# Altium footprint library cat.PcbLib: 78 footprints (part 2 of 5)
Each footprint in its own frame and in the unit in brackets; x right, y up, seen from the top. Pads: shape width x height; smd on the part's side, far side on the other; paste and mask are expansions set on the pad; w line width, h text height; cw(c..) or ccw(c..) is an arc to the next point about the centre after c.
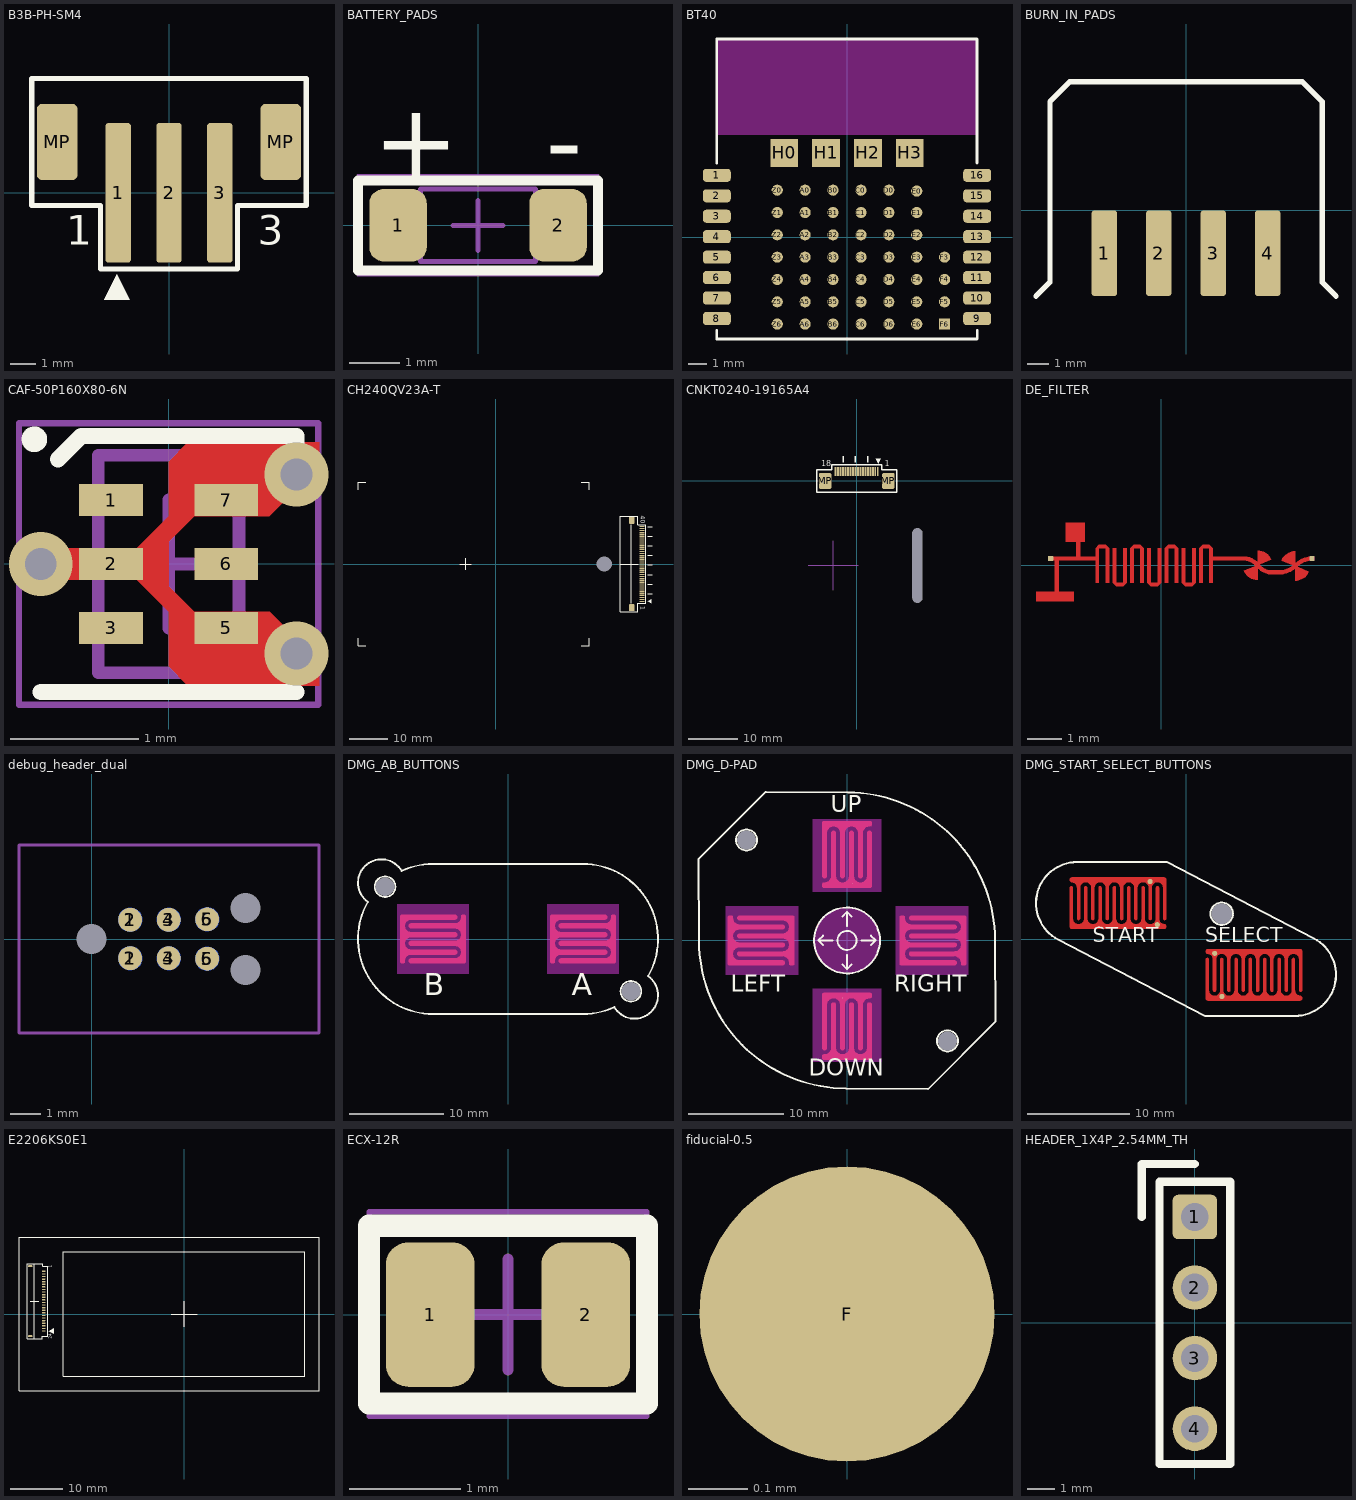
[diagram p1: the footprints below, top view; thin cyan lines are the x and y axes]

## B3B-PH-SM4 [mm]
pads (5):
  rrect25% 1x5.5 smd: 1(-2,0) 2(0,0) 3(2,0)
  rrect25% 1.6x3 smd: MP(-4.4,2) MP(4.4,2)
Top Overlay:
  region: -2.05,-3.2 -2.55,-4.2 -1.55,-4.2
  lines w0.2: -5.4,-0.5 -5.4,4.5 5.4,4.5 5.4,-0.5 2.7,-0.5 2.7,-3 -2.7,-3 -2.7,-0.5 -5.4,-0.5
  text "1" at -4.036,-2.442 h2
  text "3" at 3.481,-2.431 h2
3D body "B3B-PH-SM4-TB.STEP": height 6.6, standoff 0, extent -4.975,-2.5 4.975,4.5

## BATTERY_PADS [mm]
height 0.95
pads (2):
  rrect50% 1.15x1.45 smd: 1(-1.6,0) 2(1.6,0)
Top Overlay:
  lines w0.2: -2.4,-0.9 -2.4,0.9 2.4,0.9 2.4,-0.9 -2.4,-0.9
  text "+" at -2.1,0.95 h1.5
  text "-" at 2.1,0.95 h1.5
Mechanical 13:
  lines w0.1: -1.15,-0.725 -1.15,0.725 1.15,0.725 1.15,-0.725 -1.15,-0.725
Mechanical 15:
  lines w0.05: -2.4,-1 -2.4,1 2.4,1 2.4,-1 -2.4,-1
  lines w0.1: -0.5,0 0.5,0 ; 0,-0.5 0,0.5

## BT40 [mm] "BLE Module"
pads (66):
  rrect50% 1.5x0.7 smd: 1(-7,3.332) 2(-7,2.232) 3(-7,1.132) 4(-7,0.032) 5(-7,-1.068) 6(-7,-2.168) 7(-7,-3.268) 8(-7,-4.368) 9(7,-4.368) 10(7,-3.268) 11(7,-2.168) 12(7,-1.068) 13(7,0.032) 14(7,1.132) 15(7,2.232) 16(7,3.332)
  round 0.6 smd: A0(-2.25,2.533) A1(-2.25,1.333) A2(-2.25,0.133) A3(-2.25,-1.067) A4(-2.25,-2.267) A5(-2.25,-3.467) A6(-2.25,-4.667) B0(-0.75,2.533) B1(-0.75,1.333) B2(-0.75,0.133) B3(-0.75,-1.067) B4(-0.75,-2.267) B5(-0.75,-3.467) B6(-0.75,-4.667) C0(0.75,2.533) C1(0.75,1.333) C2(0.75,0.133) C3(0.75,-1.067) C4(0.75,-2.267) C5(0.75,-3.467) C6(0.75,-4.667) D0(2.25,2.533) D1(2.25,1.333) D2(2.25,0.133) D3(2.25,-1.067) D4(2.25,-2.267) D5(2.25,-3.467) D6(2.25,-4.667) E0(3.75,2.485) E1(3.75,1.333) E2(3.75,0.133) E3(3.75,-1.067) E4(3.75,-2.267) E5(3.75,-3.467) E6(3.75,-4.667) F3(5.25,-1.067) F4(5.25,-2.267) F5(5.25,-3.467) Z0(-3.75,2.533) Z1(-3.75,1.333) Z2(-3.75,0.133) Z3(-3.75,-1.067) Z4(-3.75,-2.267) Z5(-3.75,-3.467) Z6(-3.75,-4.667)
  rect 0.6x0.6 smd: F6(5.25,-4.667)
  rect 1.5x1.5 smd: H0(-3.375,4.533) H1(-1.125,4.533) H2(1.125,4.533) H3(3.375,4.533)
Top Layer keep-out:
  rectangle: -7,5.5 6.997,10.662
Top Overlay:
  lines w0.152: -7.005,-5.464 -7.005,-5 ; -7.003,-5.468 6.997,-5.468 ; -7,4 -7,10.654 -6.992,10.662 6.997,10.662 6.997,4 ; 7,-5.457 7,-5
3D body "bt40_ble_module.step": height 2.01, standoff 0.01, extent -6.997,-5.378 7.003,10.662

## BURN_IN_PADS [mm]
pads (4):
  rrect25% 1.2x4 smd paste-2539.97 mask+0: 1(-3.81,-2) 2(-1.27,-2) 3(1.27,-2) 4(3.81,-2)
Top Overlay:
  lines w0.25: -7,-4 -6.35,-3.35 -6.35,3.81 -6.35,5.08 -5.43,6 5.43,6 6.35,5.08 6.35,-3.107 6.35,-3.35 7,-4

## CAF-50P160X80-6N [mm] "Chip Array, Flat, 6-Leads, Pitch 0,50mm,  Body 1,60x0,80mm,  IPC Medium Density"
height 0.7
pads (6):
  rect 0.5x0.25 smd mask+0.08: 1(-0.45,0.5) 2(-0.45,0) 3(-0.45,-0.5) 5(0.45,-0.5) 6(0.45,0) 7(0.45,0.5)
via -1,0 diameter 0.5 hole 0.25
via 1,0.7 diameter 0.5 hole 0.25
via 1,-0.7 diameter 0.5 hole 0.25
Top Layer:
  region: 0.786,0.375 0.2,0.375 0,0.175 0,-0.175 0.2,-0.375 0.789,-0.375 1.175,-0.761 1.175,-0.95 0.15,-0.95 0,-0.8 0,-0.375 -0.25,-0.125 -0.8,-0.125 -0.9,-0.225 -1,-0.225 -1,0.225 -0.9,0.225 -0.8,0.125 -0.25,0.125 0,0.375 0,0.8 0.15,0.95 1.175,0.95 1.175,0.764
Top Overlay:
  circle w0.1: c-1.05,0.975 r0.05
  lines w0.127: -1,-1 1,-1 ; -0.865,0.819 -0.858,0.826 ; 1,0.683 1,1 -0.683,1 -0.857,0.826 ; -0.858,0.826 -0.857,0.826
Mechanical 13:
  lines w0.1: -0.55,-0.85 -0.55,0.85 0.55,0.85 0.55,-0.85 -0.55,-0.85
Mechanical 15:
  lines w0.05: -1.17,-1.1 -1.17,1.1 1.17,1.1 1.17,-1.1 -1.17,-1.1
  lines w0.1: -0.5,0 0.5,0 ; 0,-0.5 0,0.5
3D body: height 0.7, standoff 0, extent -0.525,-0.85 0.475,0.85
3D body: height 0.7, standoff 0, extent -0.087,0.725 0.088,0.875
3D body: height 0.7, standoff 0, extent -0.087,-0.875 0.088,-0.725
3D body: height 0.7, standoff 0.5, extent -0.087,0.15 0.088,0.45

## CH240QV23A-T [mm]
pads (43):
  rrect25% 1.3x0.3 smd: 1(38.2,-9.75) 2(38.2,-9.25) 3(38.2,-8.75) 4(38.2,-8.25) 5(38.2,-7.75) 6(38.2,-7.25) 7(38.2,-6.75) 8(38.2,-6.25) 9(38.2,-5.75) 10(38.2,-5.25) 11(38.2,-4.75) 12(38.2,-4.25) 13(38.2,-3.75) 14(38.2,-3.25) 15(38.2,-2.75) 16(38.2,-2.25) 17(38.2,-1.75) 18(38.2,-1.25) 19(38.2,-0.75) 20(38.2,-0.25) 21(38.2,0.25) 22(38.2,0.75) 23(38.2,1.25) 24(38.2,1.75) 25(38.2,2.25) 26(38.2,2.75) 27(38.2,3.25) 28(38.2,3.75) 29(38.2,4.25) 30(38.2,4.75) 31(38.2,5.25) 32(38.2,5.75) 33(38.2,6.25) 34(38.2,6.75) 35(38.2,7.25) 36(38.2,7.75) 37(38.2,8.25) 38(38.2,8.75) 39(38.2,9.25) 40(38.2,9.75)
  rrect25% 1.4x1.8 smd: MP(35.55,-11.4) MP(35.55,11.4)
  round 0 hole 4 square unplated: ""(28.4,0)
Top Overlay:
  region: 39.7,-9.75 40.7,-10.25 40.7,-9.25
  lines w0.2: -35.91,-19.4 -35.91,-21.4 -33.9,-21.4 ; -35.91,19.4 -35.91,21.4 -33.9,21.4 ; -9.35,0 -6.35,0 ; -7.81,-1.5 -7.81,1.5 ; 22.4,-21.4 24.4,-21.4 24.4,-19.4 ; 22.4,21.4 24.4,21.4 24.4,19.4 ; 32.6,0 37.3,0 ; 35.4,-10.2 35.4,10.2
  lines w0.3: 39.7,-7.75 40.95,-7.75 ; 39.7,-5.25 40.95,-5.25 ; 39.7,-2.75 40.95,-2.75 ; 39.7,-0.25 40.95,-0.25 ; 39.7,2.25 40.95,2.25 ; 39.7,4.75 40.95,4.75 ; 39.7,7.25 40.95,7.25 ; 39.7,9.75 40.95,9.75 ; 32.55,-12.5 32.55,12.5 37.05,12.5 37.05,10.25 39.2,10.25 39.2,-10.25 37.05,-10.25 37.05,-12.5 32.55,-12.5
  text "1" at 37.558,-10.964 h2
  text "40" at 37.569,12.539 h2
3D body "0.5-40p_xjh2.0_043_flat_flex_connector.step": height 2.26, standoff 0.01, extent 31.85,-12.05 38.35,12.05
3D body "ch240qv23a_lcd.sldprt": height 3.5, standoff 0, extent -35.865,-21.36 25.195,21.36

## CNKT0240-19165A4 [mm]
pads (21):
  rrect25% 0.35x1.8 smd: 1(4.25,1.9) 2(3.75,1.9) 3(3.25,1.9) 4(2.75,1.9) 5(2.25,1.9) 6(1.75,1.9) 7(1.25,1.9) 8(0.75,1.9) 9(0.25,1.9) 10(-0.25,1.9) 11(-0.75,1.9) 12(-1.25,1.9) 13(-1.75,1.9) 14(-2.25,1.9) 15(-2.75,1.9) 16(-3.25,1.9) 17(-3.75,1.9) 18(-4.25,1.9)
  rrect25% 2.5x3.2 smd: MP(-6.35,0) MP(6.35,0)
  rrect50% 0x0 hole 2 slot 15 at 90 deg unplated: ""(12.2,-17)
Top Overlay:
  region: 4.3,3.45 4.8,4.45 3.8,4.45
  lines w0.3: -2.75,3.7 -2.75,4.95 ; -0.25,3.7 -0.25,4.95 ; 2.25,3.7 2.25,4.95 ; -8,-2.3 -8,2.2 -5,2.2 -5,3.2 5,3.2 5,2.2 8,2.2 8,-2.3 -8,-2.3
  text "1" at 5.664,2.558 h2
  text "18" at -7.158,2.569 h2
Bottom Overlay:
  lines w0.2: -32.11,-36.3 -32.11,-38.36 -30.1,-38.36 ; -32.11,2.3 -32.11,4.36 -30.1,4.36 ; 26.2,-38.36 28.2,-38.36 28.2,-36.3 ; 26.2,4.36 28.2,4.36 28.2,2.3
Mechanical 15:
  lines w0.2: -9.73,-17 -4.73,-17 ; -4.73,-22 -4.73,-17 ; -4.73,-12 -4.73,-17 ; 0.27,-17 -4.73,-17
3D body "cnkt0240-19165a2_lcd.sldprt": height 3.5, standoff 0, extent -32.11,-38.36 29.35,4.36

## DE_FILTER [mm]
pads (2):
  rrect25% 0.15x0.15 smd mask+0: MAGIC_IN(-3.2,0.2) MAGIC_OUT(4.375,0.2)
Top Layer:
  rectangle: -2.775,0.675 -2.2,1.25
  rectangle: -3.625,-1.05 -2.525,-0.75
  region: -1.9,-0.5 -1.8,-0.5 -1.8,0.5 -1.6,0.5 -1.6,-0.5 -1.5,-0.5 -1.5,0.5 -1.6,0.6 -1.8,0.6 -1.9,0.5
  region: -1,0.5 -1.1,0.5 -1.1,-0.5 -1.3,-0.5 -1.3,0.5 -1.4,0.5 -1.4,-0.5 -1.3,-0.6 -1.1,-0.6 -1,-0.5
  region: -0.9,-0.5 -0.8,-0.5 -0.8,0.5 -0.6,0.5 -0.6,-0.5 -0.5,-0.5 -0.5,0.5 -0.6,0.6 -0.8,0.6 -0.9,0.5
  region: 0,0.5 -0.1,0.5 -0.1,-0.5 -0.3,-0.5 -0.3,0.5 -0.4,0.5 -0.4,-0.5 -0.3,-0.6 -0.1,-0.6 0,-0.5
  region: 0.1,-0.5 0.2,-0.5 0.2,0.5 0.4,0.5 0.4,-0.5 0.5,-0.5 0.5,0.5 0.4,0.6 0.2,0.6 0.1,0.5
  region: 1,0.5 0.9,0.5 0.9,-0.5 0.7,-0.5 0.7,0.5 0.6,0.5 0.6,-0.5 0.7,-0.6 0.9,-0.6 1,-0.5
  region: 1.1,-0.5 1.2,-0.5 1.2,0.5 1.4,0.5 1.4,-0.5 1.5,-0.5 1.5,0.5 1.4,0.6 1.2,0.6 1.1,0.5
  region: 2.4,-0.155 2.718,-0.018 2.793,0.082 2.793,0.432 2.856,0.432 2.977,0.396 3.082,0.326 3.162,0.228 3.186,0.17 3.182,0.168 2.868,0.032 2.793,-0.068 2.793,-0.418 2.73,-0.418 2.609,-0.381 2.505,-0.311 2.425,-0.213
  region: 4.275,-0.18 3.957,-0.043 3.882,0.057 3.882,0.407 3.819,0.407 3.698,0.371 3.593,0.301 3.513,0.203 3.489,0.145 3.493,0.143 3.807,0.007 3.882,-0.093 3.882,-0.443 3.945,-0.443 4.066,-0.406 4.17,-0.336 4.25,-0.238
  lines w0.127: -3.2,0.2 -2.6,0.2 -1.9,0.2 ; -3.025,-0.925 -3.025,0.2 ; -2.4,0.225 -2.4,0.875 ; 1.5,0.2 2.4,0.2 cw(c2.4,-0.283) 2.741,0.059 2.859,-0.059 ccw(c3.2,0.283) 3.2,-0.2 3.417,-0.2 ccw(c3.417,0.483) 3.9,0 cw(c4.383,-0.483) 4.383,0.2

## debug_header_dual [mm]
pads (15):
  round 0.787 smd paste-2: 1(1.27,-0.635) 2(1.27,0.635) 3(2.54,-0.635) 4(2.54,0.635) 5(3.81,-0.65) 6(3.81,0.65)
  round 0.787 smd far side paste-2: 1(1.27,0.635) 2(1.27,-0.635) 3(2.54,0.635) 4(2.54,-0.635) 5(3.81,0.65) 6(3.81,-0.65)
  round 0 hole 0.991 unplated: ""(0,0) ""(5.08,-1.016) ""(5.08,1.016)
Top Courtyard:
  lines w0.1: -2.4,-3.1 7.5,-3.1 7.5,3.1 -2.4,3.1 -2.4,-3.1

## DMG_AB_BUTTONS [mm] "A and B buttons for the gameboy GMG"
pads (6):
  round 0.025 smd paste-2539.97: A1(4.9,0.5) A2(11.1,1.4) B1(-11.1,0.5) B2(-4.9,1.4)
  round 0 hole 2 unplated: ""(-13.113,5.578) ""(13.113,-5.578)
Top Layer:
  region: -10.333,-2.6 -10.368,-2.6 -10.436,-2.582 -10.497,-2.547 -10.547,-2.497 -10.582,-2.436 -10.6,-2.368 -10.6,-2.298 -10.582,-2.23 -10.547,-2.17 -10.497,-2.12 -10.436,-2.085 -10.368,-2.067 -10.333,-2.067 -5.667,-2.067 -5.614,-2.065 -5.511,-2.048 -5.412,-2.016 -5.318,-1.968 -5.234,-1.907 -5.16,-1.833 -5.098,-1.748 -5.051,-1.655 -5.018,-1.556 -5.002,-1.452 -5.002,-1.348 -5.018,-1.244 -5.051,-1.145 -5.098,-1.052 -5.16,-0.967 -5.234,-0.893 -5.318,-0.832 -5.412,-0.784 -5.511,-0.752 -5.614,-0.735 -5.667,-0.733 -10.333,-0.733 -10.368,-0.733 -10.436,-0.715 -10.497,-0.68 -10.547,-0.63 -10.582,-0.57 -10.6,-0.502 -10.6,-0.432 -10.582,-0.364 -10.547,-0.303 -10.497,-0.253 -10.436,-0.218 -10.368,-0.2 -10.333,-0.2 -5.667,-0.2 -5.614,-0.198 -5.511,-0.182 -5.412,-0.149 -5.318,-0.102 -5.234,-0.04 -5.16,0.034 -5.098,0.118 -5.051,0.212 -5.018,0.311 -5.002,0.414 -5.002,0.519 -5.018,0.622 -5.051,0.722 -5.098,0.815 -5.16,0.9 -5.234,0.974 -5.318,1.035 -5.412,1.083 -5.511,1.115 -5.614,1.131 -5.667,1.133 -10.333,1.133 -10.368,1.133 -10.436,1.152 -10.497,1.187 -10.547,1.236 -10.582,1.297 -10.6,1.365 -10.6,1.435 -10.582,1.503 -10.547,1.564 -10.497,1.613 -10.436,1.648 -10.368,1.667 -10.333,1.667 -5.667,1.667 -5.621,1.668 -5.53,1.681 -5.442,1.706 -5.358,1.742 -5.28,1.79 -5.21,1.848 -5.148,1.915 -5.095,1.99 -5.054,2.072 -5.023,2.158 -5.006,2.248 -5,2.339 -5.002,2.385 -5.004,2.405 -4.998,2.446 -4.985,2.485 -4.963,2.521 -4.935,2.551 -4.902,2.575 -4.864,2.592 -4.823,2.6 -4.803,2.6 -4.7,2.6 -4.68,2.6 -4.642,2.592 -4.605,2.577 -4.573,2.555 -4.545,2.527 -4.523,2.495 -4.508,2.458 -4.5,2.42 -4.5,2.4 -4.5,-2.4 -4.5,-2.42 -4.508,-2.458 -4.523,-2.495 -4.545,-2.527 -4.573,-2.555 -4.605,-2.577 -4.642,-2.592 -4.68,-2.6 -4.7,-2.6
  region: -11.3,-2.6 -11.32,-2.6 -11.358,-2.592 -11.395,-2.577 -11.427,-2.555 -11.455,-2.527 -11.477,-2.495 -11.492,-2.458 -11.5,-2.42 -11.5,-2.4 -11.5,2.4 -11.5,2.42 -11.492,2.458 -11.477,2.495 -11.455,2.527 -11.427,2.555 -11.395,2.577 -11.358,2.592 -11.32,2.6 -11.3,2.6 -5.667,2.6 -5.632,2.6 -5.564,2.582 -5.503,2.547 -5.453,2.497 -5.418,2.436 -5.4,2.368 -5.4,2.298 -5.418,2.23 -5.453,2.17 -5.503,2.12 -5.564,2.085 -5.632,2.067 -5.667,2.067 -10.333,2.067 -10.386,2.065 -10.489,2.048 -10.588,2.016 -10.682,1.968 -10.766,1.907 -10.84,1.833 -10.902,1.748 -10.949,1.655 -10.982,1.556 -10.998,1.452 -10.998,1.348 -10.982,1.244 -10.949,1.145 -10.902,1.052 -10.84,0.967 -10.766,0.893 -10.682,0.832 -10.588,0.784 -10.489,0.752 -10.386,0.735 -10.333,0.733 -5.667,0.733 -5.632,0.733 -5.564,0.715 -5.503,0.68 -5.453,0.63 -5.418,0.57 -5.4,0.502 -5.4,0.432 -5.418,0.364 -5.453,0.303 -5.503,0.253 -5.564,0.218 -5.632,0.2 -5.667,0.2 -10.333,0.2 -10.386,0.198 -10.489,0.182 -10.588,0.149 -10.682,0.102 -10.766,0.04 -10.84,-0.034 -10.902,-0.118 -10.949,-0.212 -10.982,-0.311 -10.998,-0.414 -10.998,-0.519 -10.982,-0.622 -10.949,-0.722 -10.902,-0.815 -10.84,-0.9 -10.766,-0.974 -10.682,-1.035 -10.588,-1.083 -10.489,-1.115 -10.386,-1.131 -10.333,-1.133 -5.667,-1.133 -5.632,-1.133 -5.564,-1.152 -5.503,-1.187 -5.453,-1.236 -5.418,-1.297 -5.4,-1.365 -5.4,-1.435 -5.418,-1.503 -5.453,-1.564 -5.503,-1.613 -5.564,-1.648 -5.632,-1.667 -5.667,-1.667 -10.333,-1.667 -10.379,-1.668 -10.47,-1.681 -10.558,-1.706 -10.642,-1.742 -10.72,-1.79 -10.79,-1.848 -10.852,-1.915 -10.905,-1.99 -10.946,-2.072 -10.976,-2.158 -10.994,-2.248 -11,-2.339 -10.998,-2.385 -10.996,-2.405 -11.002,-2.446 -11.015,-2.485 -11.037,-2.521 -11.065,-2.551 -11.098,-2.575 -11.136,-2.592 -11.177,-2.6 -11.197,-2.6
  region: 5.667,-2.067 10.333,-2.067 10.386,-2.065 10.489,-2.048 10.588,-2.016 10.682,-1.968 10.766,-1.907 10.84,-1.833 10.902,-1.748 10.949,-1.655 10.982,-1.556 10.998,-1.452 10.998,-1.348 10.982,-1.244 10.949,-1.145 10.902,-1.052 10.84,-0.967 10.766,-0.893 10.682,-0.832 10.588,-0.784 10.489,-0.752 10.386,-0.735 10.333,-0.733 5.667,-0.733 5.632,-0.733 5.564,-0.715 5.503,-0.68 5.453,-0.63 5.418,-0.57 5.4,-0.502 5.4,-0.432 5.418,-0.364 5.453,-0.303 5.503,-0.253 5.564,-0.218 5.632,-0.2 5.667,-0.2 10.333,-0.2 10.386,-0.198 10.489,-0.182 10.588,-0.149 10.682,-0.102 10.766,-0.04 10.84,0.034 10.902,0.118 10.949,0.212 10.982,0.311 10.998,0.414 10.998,0.519 10.982,0.622 10.949,0.722 10.902,0.815 10.84,0.9 10.766,0.974 10.682,1.035 10.588,1.083 10.489,1.115 10.386,1.131 10.333,1.133 5.667,1.133 5.632,1.133 5.564,1.152 5.503,1.187 5.453,1.236 5.418,1.297 5.4,1.365 5.4,1.435 5.418,1.503 5.453,1.564 5.503,1.613 5.564,1.648 5.632,1.667 5.667,1.667 10.333,1.667 10.379,1.668 10.47,1.681 10.558,1.706 10.642,1.742 10.72,1.79 10.79,1.848 10.852,1.915 10.905,1.99 10.946,2.072 10.976,2.158 10.994,2.248 11,2.339 10.998,2.385 10.996,2.405 11.002,2.446 11.015,2.485 11.037,2.521 11.065,2.551 11.098,2.575 11.136,2.592 11.177,2.6 11.197,2.6 11.3,2.6 11.32,2.6 11.358,2.592 11.395,2.577 11.427,2.555 11.455,2.527 11.477,2.495 11.492,2.458 11.5,2.42 11.5,2.4 11.5,-2.4 11.5,-2.42 11.492,-2.458 11.477,-2.495 11.455,-2.527 11.427,-2.555 11.395,-2.577 11.358,-2.592 11.32,-2.6 11.3,-2.6 5.667,-2.6 5.632,-2.6 5.564,-2.582 5.503,-2.547 5.453,-2.497 5.418,-2.436 5.4,-2.368 5.4,-2.298 5.418,-2.23 5.453,-2.17 5.503,-2.12 5.564,-2.085 5.632,-2.067
  region: 4.5,-2.4 4.5,-2.42 4.508,-2.458 4.523,-2.495 4.545,-2.527 4.573,-2.555 4.605,-2.577 4.642,-2.592 4.68,-2.6 4.7,-2.6 4.803,-2.6 4.823,-2.6 4.864,-2.592 4.902,-2.575 4.935,-2.551 4.963,-2.521 4.985,-2.485 4.998,-2.446 5.004,-2.405 5.002,-2.385 5,-2.339 5.006,-2.248 5.023,-2.158 5.054,-2.072 5.095,-1.99 5.148,-1.915 5.21,-1.848 5.28,-1.79 5.358,-1.742 5.442,-1.706 5.53,-1.681 5.621,-1.668 5.667,-1.667 10.333,-1.667 10.368,-1.667 10.436,-1.648 10.497,-1.613 10.547,-1.564 10.582,-1.503 10.6,-1.435 10.6,-1.365 10.582,-1.297 10.547,-1.236 10.497,-1.187 10.436,-1.152 10.368,-1.133 10.333,-1.133 5.667,-1.133 5.614,-1.131 5.511,-1.115 5.412,-1.083 5.318,-1.035 5.234,-0.974 5.16,-0.9 5.098,-0.815 5.051,-0.722 5.018,-0.622 5.002,-0.519 5.002,-0.414 5.018,-0.311 5.051,-0.212 5.098,-0.118 5.16,-0.034 5.234,0.04 5.318,0.102 5.412,0.149 5.511,0.182 5.614,0.198 5.667,0.2 10.333,0.2 10.368,0.2 10.436,0.218 10.497,0.253 10.547,0.303 10.582,0.364 10.6,0.432 10.6,0.502 10.582,0.57 10.547,0.63 10.497,0.68 10.436,0.715 10.368,0.733 10.333,0.733 5.667,0.733 5.614,0.735 5.511,0.752 5.412,0.784 5.318,0.832 5.234,0.893 5.16,0.967 5.098,1.052 5.051,1.145 5.018,1.244 5.002,1.348 5.002,1.452 5.018,1.556 5.051,1.655 5.098,1.748 5.16,1.833 5.234,1.907 5.318,1.968 5.412,2.016 5.511,2.048 5.614,2.065 5.667,2.067 10.333,2.067 10.368,2.067 10.436,2.085 10.497,2.12 10.547,2.17 10.582,2.23 10.6,2.298 10.6,2.368 10.582,2.436 10.547,2.497 10.497,2.547 10.436,2.582 10.368,2.6 10.333,2.6 4.7,2.6 4.68,2.6 4.642,2.592 4.605,2.577 4.573,2.555 4.545,2.527 4.523,2.495 4.508,2.458 4.5,2.42 4.5,2.4
Top Layer keep-out:
  region: -11.811,3.727 -11.811,-3.7 -4.191,-3.7 -4.191,3.727
  region: 11.811,-3.727 11.811,3.7 4.191,3.7 4.191,-3.727
Top Overlay:
  circle w0.2: c-13.113,5.578 r1.1
  circle w0.2: c13.113,-5.578 r1.1
  lines w0.2: -14.949,3.963 ccw(c-8,0) -8,-8 8,-8 ccw(c8,0) 11.345,-7.267 ccw(c13.5,-6) 14.949,-3.963 ccw(c8,0) 8,8 -8,8 ccw(c-8,0) -11.345,7.267 ccw(c-13.5,6) -14.949,3.963
  text "B" at -8.967,-6.781 h4
  text "A" at 6.801,-6.781 h4
Top Solder:
  region: -8,-3.7 -8.243,-3.7 -8.723,-3.637 -9.192,-3.511 -9.64,-3.326 -10.06,-3.083 -10.445,-2.788 -10.788,-2.445 -11.083,-2.06 -11.326,-1.64 -11.511,-1.192 -11.637,-0.723 -11.7,-0.243 -11.7,0 -11.7,0.243 -11.637,0.723 -11.511,1.192 -11.326,1.64 -11.083,2.06 -10.788,2.445 -10.445,2.788 -10.06,3.083 -9.64,3.326 -9.192,3.511 -8.723,3.637 -8.243,3.7 -8,3.7 -7.757,3.7 -7.277,3.637 -6.808,3.511 -6.36,3.326 -5.94,3.083 -5.555,2.788 -5.212,2.445 -4.917,2.06 -4.674,1.64 -4.489,1.192 -4.363,0.723 -4.3,0.243 -4.3,0 -4.3,-0.243 -4.363,-0.723 -4.489,-1.192 -4.674,-1.64 -4.917,-2.06 -5.212,-2.445 -5.555,-2.788 -5.94,-3.083 -6.36,-3.326 -6.808,-3.511 -7.277,-3.637 -7.757,-3.7
  region: 8,3.7 8.243,3.7 8.723,3.637 9.192,3.511 9.64,3.326 10.06,3.083 10.445,2.788 10.788,2.445 11.083,2.06 11.326,1.64 11.511,1.192 11.637,0.723 11.7,0.243 11.7,0 11.7,-0.243 11.637,-0.723 11.511,-1.192 11.326,-1.64 11.083,-2.06 10.788,-2.445 10.445,-2.788 10.06,-3.083 9.64,-3.326 9.192,-3.511 8.723,-3.637 8.243,-3.7 8,-3.7 7.757,-3.7 7.277,-3.637 6.808,-3.511 6.36,-3.326 5.94,-3.083 5.555,-2.788 5.212,-2.445 4.917,-2.06 4.674,-1.64 4.489,-1.192 4.363,-0.723 4.3,-0.243 4.3,0 4.3,0.243 4.363,0.723 4.489,1.192 4.674,1.64 4.917,2.06 5.212,2.445 5.555,2.788 5.94,3.083 6.36,3.326 6.808,3.511 7.277,3.637 7.757,3.7
3D body "ab_plastic.sldprt": height 9.4, standoff 2.5, extent -1.313,-7.67 17.313,7.67
3D body "ab_plastic.sldprt": height 9.4, standoff 2.5, extent -17.313,-7.67 1.313,7.67
3D body "ab_silicone.sldprt": height 5, standoff 0, extent -15.997,-8.493 15.997,8.5

## DMG_D-PAD [mil] "D-pad for gameboy DMG buttons"
pads (10):
  round 1 smd paste-99999: D1(-56.1,-474.07) D2(-17.2,-237.18) L1(-471.48,52.56) L2(-234.6,20.74) R1(474.07,-57.04) R2(237.18,-18.15) U1(57.04,475.01) U2(21.69,234.6)
  round 0 hole 78.74 unplated paste-99999: ""(-414.1,414.1) ""(414.1,-414.1)
Top Layer:
  region: -484.25,-102.36 -485.03,-102.36 -486.55,-102.06 -487.98,-101.47 -489.27,-100.6 -490.37,-99.51 -491.23,-98.22 -491.82,-96.78 -492.13,-95.26 -492.13,-94.49 -492.13,94.49 -492.13,95.26 -491.82,96.78 -491.23,98.22 -490.37,99.51 -489.27,100.6 -487.98,101.47 -486.55,102.06 -485.03,102.36 -484.25,102.36 -477.9,102.36 -477.09,102.36 -475.52,102.04 -474.04,101.4 -472.73,100.48 -471.62,99.31 -470.78,97.95 -470.23,96.44 -469.99,94.85 -470.04,94.05 -470.08,92.2 -469.79,88.54 -469,84.94 -467.74,81.48 -466.02,78.23 -463.87,75.24 -461.35,72.56 -458.48,70.26 -455.33,68.36 -451.95,66.9 -448.4,65.91 -444.75,65.42 -442.91,65.35 -265.75,65.35 -264.45,65.35 -261.95,64.68 -259.7,63.39 -257.87,61.56 -256.58,59.31 -255.91,56.81 -255.91,54.22 -256.58,51.71 -257.87,49.47 -259.7,47.64 -261.95,46.34 -264.45,45.67 -265.75,45.67 -442.91,45.67 -445.04,45.59 -449.26,44.92 -453.31,43.6 -457.11,41.67 -460.56,39.16 -463.57,36.15 -466.08,32.7 -468.01,28.9 -469.33,24.85 -470,20.64 -470,16.37 -469.33,12.16 -468.01,8.11 -466.08,4.31 -463.57,0.86 -460.56,-2.15 -457.11,-4.66 -453.31,-6.59 -449.26,-7.91 -445.04,-8.58 -442.91,-8.66 -265.75,-8.66 -264.45,-8.66 -261.95,-9.33 -259.7,-10.63 -257.87,-12.46 -256.58,-14.7 -255.91,-17.21 -255.91,-19.8 -256.58,-22.3 -257.87,-24.55 -259.7,-26.38 -261.95,-27.68 -264.45,-28.35 -265.75,-28.35 -442.91,-28.35 -445.04,-28.43 -449.26,-29.1 -453.31,-30.41 -457.11,-32.35 -460.56,-34.85 -463.57,-37.87 -466.08,-41.32 -468.01,-45.12 -469.33,-49.17 -470,-53.38 -470,-57.64 -469.33,-61.85 -468.01,-65.91 -466.08,-69.71 -463.57,-73.15 -460.56,-76.17 -457.11,-78.67 -453.31,-80.61 -449.26,-81.93 -445.04,-82.59 -442.91,-82.68 -265.75,-82.68 -264.45,-82.68 -261.95,-83.35 -259.7,-84.64 -257.87,-86.48 -256.58,-88.72 -255.91,-91.22 -255.91,-93.82 -256.58,-96.32 -257.87,-98.56 -259.7,-100.4 -261.95,-101.69 -264.45,-102.36 -265.75,-102.36
  region: -102.36,484.25 -102.36,485.03 -102.06,486.55 -101.47,487.98 -100.6,489.27 -99.51,490.37 -98.22,491.23 -96.78,491.82 -95.26,492.13 -94.49,492.13 94.49,492.13 95.26,492.13 96.78,491.82 98.22,491.23 99.51,490.37 100.6,489.27 101.47,487.98 102.06,486.55 102.36,485.03 102.36,484.25 102.36,477.9 102.36,477.09 102.04,475.52 101.4,474.04 100.48,472.73 99.31,471.62 97.95,470.78 96.44,470.23 94.85,469.99 94.05,470.04 92.2,470.08 88.54,469.79 84.94,469 81.48,467.74 78.23,466.02 75.24,463.87 72.56,461.35 70.26,458.48 68.36,455.33 66.9,451.95 65.91,448.4 65.42,444.75 65.35,442.91 65.35,265.75 65.35,264.45 64.68,261.95 63.39,259.7 61.56,257.87 59.31,256.58 56.81,255.91 54.22,255.91 51.71,256.58 49.47,257.87 47.64,259.7 46.34,261.95 45.67,264.45 45.67,265.75 45.67,442.91 45.59,445.04 44.92,449.26 43.6,453.31 41.67,457.11 39.16,460.56 36.15,463.57 32.7,466.08 28.9,468.01 24.85,469.33 20.64,470 16.37,470 12.16,469.33 8.11,468.01 4.31,466.08 0.86,463.57 -2.15,460.56 -4.66,457.11 -6.59,453.31 -7.91,449.26 -8.58,445.04 -8.66,442.91 -8.66,265.75 -8.66,264.45 -9.33,261.95 -10.63,259.7 -12.46,257.87 -14.7,256.58 -17.21,255.91 -19.8,255.91 -22.3,256.58 -24.55,257.87 -26.38,259.7 -27.68,261.95 -28.35,264.45 -28.35,265.75 -28.35,442.91 -28.43,445.04 -29.1,449.26 -30.41,453.31 -32.35,457.11 -34.85,460.56 -37.87,463.57 -41.32,466.08 -45.12,468.01 -49.17,469.33 -53.38,470 -57.64,470 -61.85,469.33 -65.91,468.01 -69.71,466.08 -73.15,463.57 -76.17,460.56 -78.67,457.11 -80.61,453.31 -81.93,449.26 -82.59,445.04 -82.68,442.91 -82.68,265.75 -82.68,264.45 -83.35,261.95 -84.64,259.7 -86.48,257.87 -88.72,256.58 -91.22,255.91 -93.82,255.91 -96.32,256.58 -98.56,257.87 -100.4,259.7 -101.69,261.95 -102.36,264.45 -102.36,265.75
  region: -65.35,442.91 -65.35,444.21 -64.68,446.71 -63.39,448.96 -61.56,450.79 -59.31,452.09 -56.81,452.76 -54.22,452.76 -51.71,452.09 -49.47,450.79 -47.64,448.96 -46.34,446.71 -45.67,444.21 -45.67,442.91 -45.67,265.75 -45.59,263.62 -44.92,259.41 -43.6,255.35 -41.67,251.55 -39.16,248.11 -36.15,245.09 -32.7,242.59 -28.9,240.65 -24.85,239.33 -20.64,238.67 -16.37,238.67 -12.16,239.33 -8.11,240.65 -4.31,242.59 -0.86,245.09 2.15,248.11 4.66,251.55 6.59,255.35 7.91,259.41 8.58,263.62 8.66,265.75 8.66,442.91 8.66,444.21 9.33,446.71 10.63,448.96 12.46,450.79 14.71,452.09 17.21,452.76 19.8,452.76 22.3,452.09 24.55,450.79 26.38,448.96 27.68,446.71 28.35,444.21 28.35,442.91 28.35,265.75 28.43,263.62 29.1,259.41 30.41,255.35 32.35,251.55 34.85,248.11 37.87,245.09 41.32,242.59 45.12,240.65 49.17,239.33 53.38,238.67 57.64,238.67 61.85,239.33 65.91,240.65 69.71,242.59 73.15,245.09 76.17,248.11 78.67,251.55 80.61,255.35 81.93,259.41 82.59,263.62 82.68,265.75 82.68,442.91 82.68,444.21 83.35,446.71 84.64,448.96 86.48,450.79 88.72,452.09 91.22,452.76 93.82,452.76 96.32,452.09 98.56,450.79 100.4,448.96 101.69,446.71 102.36,444.21 102.36,442.91 102.36,224.41 102.36,223.63 102.06,222.11 101.47,220.68 100.6,219.39 99.51,218.29 98.22,217.43 96.78,216.84 95.26,216.54 94.49,216.54 -94.49,216.54 -95.26,216.54 -96.78,216.84 -98.22,217.43 -99.51,218.29 -100.6,219.39 -101.47,220.68 -102.06,222.11 -102.36,223.63 -102.36,224.41 -102.36,230.76 -102.36,231.57 -102.04,233.14 -101.4,234.62 -100.48,235.93 -99.31,237.04 -97.95,237.88 -96.44,238.43 -94.85,238.67 -94.05,238.63 -92.2,238.58 -88.54,238.88 -84.94,239.66 -81.48,240.93 -78.23,242.64 -75.24,244.79 -72.56,247.32 -70.26,250.18 -68.36,253.34 -66.9,256.72 -65.91,260.26 -65.42,263.91 -65.35,265.75
  region: 484.25,102.36 485.03,102.36 486.55,102.06 487.98,101.47 489.27,100.6 490.37,99.51 491.23,98.22 491.82,96.78 492.13,95.26 492.13,94.49 492.13,-94.49 492.13,-95.26 491.82,-96.78 491.23,-98.22 490.37,-99.51 489.27,-100.6 487.98,-101.47 486.55,-102.06 485.03,-102.36 484.25,-102.36 477.9,-102.36 477.09,-102.36 475.52,-102.04 474.04,-101.4 472.73,-100.48 471.62,-99.31 470.78,-97.95 470.23,-96.44 469.99,-94.85 470.04,-94.05 470.08,-92.2 469.79,-88.54 469,-84.94 467.74,-81.48 466.02,-78.23 463.87,-75.24 461.34,-72.56 458.48,-70.26 455.33,-68.36 451.95,-66.9 448.4,-65.91 444.75,-65.42 442.91,-65.35 265.75,-65.35 264.45,-65.35 261.95,-64.68 259.7,-63.39 257.87,-61.56 256.58,-59.31 255.91,-56.81 255.91,-54.22 256.58,-51.71 257.87,-49.47 259.7,-47.64 261.95,-46.34 264.45,-45.67 265.75,-45.67 442.91,-45.67 445.04,-45.59 449.26,-44.92 453.31,-43.6 457.11,-41.67 460.56,-39.16 463.57,-36.15 466.08,-32.7 468.01,-28.9 469.33,-24.85 470,-20.64 470,-16.37 469.33,-12.16 468.01,-8.11 466.08,-4.31 463.57,-0.86 460.56,2.15 457.11,4.66 453.31,6.59 449.26,7.91 445.04,8.58 442.91,8.66 265.75,8.66 264.45,8.66 261.95,9.33 259.7,10.63 257.87,12.46 256.58,14.7 255.91,17.21 255.91,19.8 256.58,22.3 257.87,24.55 259.7,26.38 261.95,27.68 264.45,28.35 265.75,28.35 442.91,28.35 445.04,28.43 449.26,29.1 453.31,30.41 457.11,32.35 460.56,34.85 463.57,37.87 466.08,41.32 468.01,45.12 469.33,49.17 470,53.38 470,57.64 469.33,61.85 468.01,65.91 466.08,69.71 463.57,73.15 460.56,76.17 457.11,78.67 453.31,80.61 449.26,81.93 445.04,82.59 442.91,82.68 265.75,82.68 264.45,82.68 261.95,83.35 259.7,84.64 257.87,86.48 256.58,88.72 255.91,91.22 255.91,93.82 256.58,96.32 257.87,98.56 259.7,100.4 261.95,101.69 264.45,102.36 265.75,102.36
  region: 442.91,65.35 444.21,65.35 446.71,64.68 448.96,63.39 450.79,61.56 452.09,59.31 452.76,56.81 452.76,54.22 452.09,51.71 450.79,49.47 448.96,47.64 446.71,46.34 444.21,45.67 442.91,45.67 265.75,45.67 263.62,45.59 259.41,44.92 255.35,43.6 251.55,41.67 248.11,39.16 245.09,36.15 242.59,32.7 240.65,28.9 239.33,24.85 238.67,20.64 238.67,16.37 239.33,12.16 240.65,8.11 242.59,4.31 245.09,0.86 248.11,-2.15 251.55,-4.66 255.35,-6.59 259.41,-7.91 263.62,-8.58 265.75,-8.66 442.91,-8.66 444.21,-8.66 446.71,-9.33 448.96,-10.63 450.79,-12.46 452.09,-14.71 452.76,-17.21 452.76,-19.8 452.09,-22.3 450.79,-24.55 448.96,-26.38 446.71,-27.68 444.21,-28.35 442.91,-28.35 265.75,-28.35 263.62,-28.43 259.41,-29.1 255.35,-30.41 251.55,-32.35 248.11,-34.85 245.09,-37.87 242.59,-41.32 240.65,-45.12 239.33,-49.17 238.67,-53.38 238.67,-57.64 239.33,-61.85 240.65,-65.91 242.59,-69.71 245.09,-73.15 248.11,-76.17 251.55,-78.67 255.35,-80.61 259.41,-81.93 263.62,-82.59 265.75,-82.68 442.91,-82.68 444.21,-82.68 446.71,-83.35 448.96,-84.64 450.79,-86.48 452.09,-88.72 452.76,-91.22 452.76,-93.82 452.09,-96.32 450.79,-98.56 448.96,-100.4 446.71,-101.69 444.21,-102.36 442.91,-102.36 224.41,-102.36 223.63,-102.36 222.11,-102.06 220.68,-101.47 219.39,-100.6 218.29,-99.51 217.43,-98.22 216.84,-96.78 216.54,-95.26 216.54,-94.49 216.54,94.49 216.54,95.26 216.84,96.78 217.43,98.22 218.29,99.51 219.39,100.6 220.68,101.47 222.11,102.06 223.63,102.36 224.41,102.36 230.76,102.36 231.57,102.36 233.14,102.04 234.62,101.4 235.93,100.48 237.04,99.31 237.88,97.95 238.43,96.44 238.67,94.85 238.63,94.05 238.58,92.2 238.88,88.54 239.66,84.94 240.93,81.48 242.64,78.23 244.79,75.24 247.32,72.56 250.18,70.26 253.34,68.36 256.72,66.9 260.26,65.91 263.91,65.42 265.75,65.35
  region: -442.91,-65.35 -444.21,-65.35 -446.71,-64.68 -448.96,-63.39 -450.79,-61.56 -452.09,-59.31 -452.76,-56.81 -452.76,-54.22 -452.09,-51.71 -450.79,-49.47 -448.96,-47.64 -446.71,-46.34 -444.21,-45.67 -442.91,-45.67 -265.75,-45.67 -263.62,-45.59 -259.41,-44.92 -255.35,-43.6 -251.55,-41.67 -248.11,-39.16 -245.09,-36.15 -242.59,-32.7 -240.65,-28.9 -239.33,-24.85 -238.67,-20.64 -238.67,-16.37 -239.33,-12.16 -240.65,-8.11 -242.59,-4.31 -245.09,-0.86 -248.11,2.15 -251.55,4.66 -255.35,6.59 -259.41,7.91 -263.62,8.58 -265.75,8.66 -442.91,8.66 -444.21,8.66 -446.71,9.33 -448.96,10.63 -450.79,12.46 -452.09,14.71 -452.76,17.21 -452.76,19.8 -452.09,22.3 -450.79,24.55 -448.96,26.38 -446.71,27.68 -444.21,28.35 -442.91,28.35 -265.75,28.35 -263.62,28.43 -259.41,29.1 -255.35,30.41 -251.55,32.35 -248.11,34.85 -245.09,37.87 -242.59,41.32 -240.65,45.12 -239.33,49.17 -238.67,53.38 -238.67,57.64 -239.33,61.85 -240.65,65.91 -242.59,69.71 -245.09,73.15 -248.11,76.17 -251.55,78.67 -255.35,80.61 -259.41,81.93 -263.62,82.59 -265.75,82.68 -442.91,82.68 -444.21,82.68 -446.71,83.35 -448.96,84.64 -450.79,86.48 -452.09,88.72 -452.76,91.22 -452.76,93.82 -452.09,96.32 -450.79,98.56 -448.96,100.4 -446.71,101.69 -444.21,102.36 -442.91,102.36 -224.41,102.36 -223.63,102.36 -222.11,102.06 -220.68,101.47 -219.39,100.6 -218.29,99.51 -217.43,98.22 -216.84,96.78 -216.54,95.26 -216.54,94.49 -216.54,-94.49 -216.54,-95.26 -216.84,-96.78 -217.43,-98.22 -218.29,-99.51 -219.39,-100.6 -220.68,-101.47 -222.11,-102.06 -223.63,-102.36 -224.41,-102.36 -230.76,-102.36 -231.57,-102.36 -233.14,-102.04 -234.62,-101.4 -235.93,-100.48 -237.04,-99.31 -237.88,-97.95 -238.43,-96.44 -238.67,-94.85 -238.63,-94.05 -238.58,-92.2 -238.88,-88.54 -239.66,-84.94 -240.93,-81.48 -242.64,-78.23 -244.79,-75.24 -247.32,-72.56 -250.18,-70.26 -253.34,-68.36 -256.72,-66.9 -260.26,-65.91 -263.91,-65.42 -265.75,-65.35
  region: 94.49,-492.13 95.26,-492.13 96.78,-491.82 98.22,-491.23 99.51,-490.37 100.6,-489.27 101.47,-487.98 102.06,-486.55 102.36,-485.03 102.36,-484.25 102.36,-265.75 102.36,-264.45 101.69,-261.95 100.4,-259.7 98.56,-257.87 96.32,-256.58 93.82,-255.91 91.22,-255.91 88.72,-256.58 86.48,-257.87 84.64,-259.7 83.35,-261.95 82.68,-264.45 82.68,-265.75 82.68,-442.91 82.59,-445.04 81.93,-449.26 80.61,-453.31 78.67,-457.11 76.17,-460.56 73.15,-463.57 69.71,-466.08 65.91,-468.01 61.85,-469.33 57.64,-470 53.38,-470 49.17,-469.33 45.12,-468.01 41.32,-466.08 37.87,-463.57 34.86,-460.56 32.35,-457.11 30.41,-453.31 29.1,-449.26 28.43,-445.04 28.35,-442.91 28.35,-265.75 28.35,-264.45 27.68,-261.95 26.38,-259.7 24.55,-257.87 22.3,-256.58 19.8,-255.91 17.21,-255.91 14.7,-256.58 12.46,-257.87 10.63,-259.7 9.33,-261.95 8.66,-264.45 8.66,-265.75 8.66,-442.91 8.58,-445.04 7.91,-449.25 6.59,-453.31 4.66,-457.11 2.15,-460.56 -0.86,-463.57 -4.31,-466.08 -8.11,-468.01 -12.16,-469.33 -16.37,-470 -20.64,-470 -24.85,-469.33 -28.9,-468.01 -32.7,-466.08 -36.15,-463.57 -39.16,-460.56 -41.67,-457.11 -43.6,-453.31 -44.92,-449.25 -45.59,-445.04 -45.67,-442.91 -45.67,-265.75 -45.67,-264.45 -46.34,-261.95 -47.64,-259.7 -49.47,-257.87 -51.71,-256.58 -54.22,-255.91 -56.81,-255.91 -59.31,-256.58 -61.56,-257.87 -63.39,-259.7 -64.68,-261.95 -65.35,-264.45 -65.35,-265.75 -65.35,-442.91 -65.42,-444.75 -65.91,-448.4 -66.9,-451.95 -68.36,-455.33 -70.26,-458.48 -72.56,-461.34 -75.24,-463.87 -78.23,-466.02 -81.48,-467.74 -84.94,-469 -88.54,-469.79 -92.2,-470.08 -94.05,-470.04 -94.85,-469.99 -96.44,-470.23 -97.95,-470.78 -99.31,-471.62 -100.48,-472.73 -101.4,-474.04 -102.04,-475.52 -102.36,-477.09 -102.36,-477.9 -102.36,-484.25 -102.36,-485.03 -102.06,-486.55 -101.47,-487.98 -100.6,-489.27 -99.51,-490.37 -98.22,-491.23 -96.78,-491.82 -95.26,-492.13 -94.49,-492.13
  region: 65.35,-442.91 65.35,-444.21 64.68,-446.71 63.39,-448.96 61.56,-450.79 59.31,-452.09 56.81,-452.76 54.22,-452.76 51.71,-452.09 49.47,-450.79 47.64,-448.96 46.34,-446.71 45.67,-444.21 45.67,-442.91 45.67,-265.75 45.59,-263.62 44.92,-259.41 43.6,-255.35 41.67,-251.55 39.16,-248.11 36.15,-245.09 32.7,-242.59 28.9,-240.65 24.85,-239.33 20.64,-238.67 16.37,-238.67 12.16,-239.33 8.11,-240.65 4.31,-242.59 0.86,-245.09 -2.15,-248.11 -4.66,-251.55 -6.59,-255.35 -7.91,-259.41 -8.58,-263.62 -8.66,-265.75 -8.66,-442.91 -8.66,-444.21 -9.33,-446.71 -10.63,-448.96 -12.46,-450.79 -14.7,-452.08 -17.21,-452.76 -19.8,-452.76 -22.3,-452.08 -24.55,-450.79 -26.38,-448.96 -27.68,-446.71 -28.35,-444.21 -28.35,-442.91 -28.35,-265.75 -28.43,-263.62 -29.1,-259.41 -30.41,-255.35 -32.35,-251.55 -34.85,-248.11 -37.87,-245.09 -41.32,-242.59 -45.12,-240.65 -49.17,-239.33 -53.38,-238.67 -57.64,-238.67 -61.85,-239.33 -65.91,-240.65 -69.71,-242.59 -73.15,-245.09 -76.17,-248.11 -78.67,-251.55 -80.61,-255.35 -81.93,-259.41 -82.59,-263.62 -82.68,-265.75 -82.68,-442.91 -82.68,-444.21 -83.35,-446.71 -84.64,-448.96 -86.48,-450.79 -88.72,-452.09 -91.22,-452.76 -93.82,-452.76 -96.32,-452.09 -98.56,-450.79 -100.4,-448.96 -101.69,-446.71 -102.36,-444.21 -102.36,-442.91 -102.36,-224.41 -102.36,-223.63 -102.06,-222.11 -101.47,-220.68 -100.6,-219.39 -99.51,-218.29 -98.22,-217.43 -96.78,-216.84 -95.26,-216.54 -94.49,-216.54 94.49,-216.54 95.26,-216.54 96.78,-216.84 98.22,-217.43 99.51,-218.29 100.6,-219.39 101.47,-220.68 102.06,-222.11 102.36,-223.63 102.36,-224.41 102.36,-230.76 102.36,-231.57 102.04,-233.14 101.4,-234.62 100.48,-235.93 99.31,-237.04 97.95,-237.88 96.44,-238.43 94.85,-238.67 94.05,-238.63 92.2,-238.58 88.54,-238.88 84.94,-239.66 81.48,-240.93 78.23,-242.64 75.24,-244.79 72.56,-247.32 70.26,-250.18 68.36,-253.34 66.9,-256.72 65.91,-260.26 65.42,-263.91 65.35,-265.75
Top Layer keep-out:
  region: 0,-135.83 -8.9,-135.83 -26.56,-133.5 -43.75,-128.89 -60.2,-122.08 -75.62,-113.18 -89.75,-102.34 -102.34,-89.75 -113.18,-75.62 -122.08,-60.2 -128.89,-43.75 -133.5,-26.56 -135.83,-8.9 -135.83,0 -135.83,8.9 -133.5,26.56 -128.89,43.75 -122.08,60.2 -113.18,75.62 -102.34,89.75 -89.75,102.34 -75.62,113.18 -60.2,122.08 -43.75,128.89 -26.56,133.5 -8.9,135.83 0,135.83 8.9,135.83 26.56,133.5 43.75,128.89 60.2,122.08 75.62,113.18 89.75,102.34 102.34,89.75 113.18,75.62 122.08,60.2 128.89,43.75 133.5,26.56 135.83,8.9 135.83,0 135.83,-8.9 133.5,-26.56 128.89,-43.75 122.08,-60.2 113.18,-75.62 102.34,-89.75 89.75,-102.34 75.62,-113.18 60.2,-122.08 43.75,-128.89 26.56,-133.5 8.9,-135.83
  region: 500,-141.73 500,141.73 200,141.73 200,-141.73
  region: -500,141.73 -500,-141.73 -200,-141.73 -200,141.73
  region: -141.74,-500 141.73,-500 141.73,-200 -141.74,-200
  region: 141.73,500 -141.73,500 -141.73,200 141.73,200
Top Overlay:
  circle w7.87: c0,0 r135.83
  circle w7.87: c414.1,-414.1 r43.31
  circle w7.87: c-414.1,414.1 r43.31
  circle w7.87: c0,0 r39.37
  lines w7.87: -98.43,-19.68 -118.11,0 ; -98.43,19.68 -118.11,0 ; -59.06,0 -118.11,0 ; -19.68,-98.43 0,-118.11 ; -19.68,98.43 0,118.11 ; 0,-59.06 0,-118.11 ; 0,59.06 0,118.11 ; 19.68,-98.43 0,-118.11 ; 19.68,98.43 0,118.11 ; 59.06,0 118.11,0 ; 98.43,-19.68 118.11,0 ; 98.43,19.68 118.11,0 ; -612.45,334.07 -610.22,-4.03 ccw(c0,0) -4.03,-610.22 334.07,-612.45 612.45,-334.07 610.22,4.03 ccw(c0,0) 4.03,610.22 -334.07,612.45 -612.45,334.07
  text "RIGHT" at 195.36,-234.66 h118.11
  text "LEFT" at -478.41,-234.63 h118.11
  text "DOWN" at -158.67,-581.12 h118.11
  text "UP" at -66.86,506.15 h118.11
Top Solder:
  drawing of 4 lines, arcs and shapes, not listed
3D body "d-pad_silicone.sldprt": height 141.73, standoff 0, extent -904.31,-904.31 904.31,904.31
3D body "d-pad_plastic.sldprt": height 406.04, standoff 0, extent -501.97,-501.97 501.97,501.97

## DMG_START_SELECT_BUTTONS [mm] "Start and Select buttons for the gameboy DMG"
pads (5):
  round 0.5 smd: SELECT1(2.8,-1.4) SELECT2(3.5,-5.6) START1(-3.5,5.6) START2(-2.8,1.4)
  round 0 hole 2 unplated: ""(3.481,2.473)
Top Layer:
  region: 313 vertices and 0 holes, not listed, extent 1.933,-6 11.333,-1.85
  region: 313 vertices and 0 holes, not listed, extent 1.933,-5.15 11.333,-1
  region: 313 vertices and 0 holes, not listed, extent -11.333,1 -1.933,5.15
  region: 313 vertices and 0 holes, not listed, extent -11.333,1.85 -1.933,6
Top Overlay:
  circle w0.1: c-5.313,-3.774 r0.05
  circle w0.2: c3.481,2.473 r1.092
  lines w0.2: -12.479,-0.049 cw(c-10.633,3.5) -10.633,7.5 -1.852,7.5 12.479,0.049 cw(c10.633,-3.5) 10.633,-7.5 1.852,-7.5 -12.479,-0.049
  text "START" at -9.076,-0.8 h2.5
  text "SELECT" at 1.9,-0.8 h2.5
Top Solder:
  region: 11.4,-1.1 11.4,-5.9 11.4,-5.94 11.37,-6.013 11.313,-6.07 11.24,-6.1 11.2,-6.1 2.1,-6.1 2.06,-6.1 1.987,-6.07 1.93,-6.013 1.9,-5.94 1.9,-5.9 1.9,-1.1 1.9,-1.06 1.93,-0.987 1.987,-0.93 2.06,-0.9 2.1,-0.9 11.2,-0.9 11.24,-0.9 11.313,-0.93 11.37,-0.987 11.4,-1.06
  region: -11.4,1.1 -11.4,5.9 -11.4,5.94 -11.37,6.013 -11.313,6.07 -11.24,6.1 -11.2,6.1 -2.1,6.1 -2.06,6.1 -1.987,6.07 -1.93,6.013 -1.9,5.94 -1.9,5.9 -1.9,1.1 -1.9,1.06 -1.93,0.987 -1.987,0.93 -2.06,0.9 -2.1,0.9 -11.2,0.9 -11.24,0.9 -11.313,0.93 -11.37,0.987 -11.4,1.06
3D body "start_select_silicone.sldprt": height 9, standoff 0, extent -14.622,-7.5 14.622,7.5

## E2206KS0E1 [mm]
pads (26):
  rrect50% 0.65x0.25 smd: 1(-27.05,8.222) 2(-27.05,7.722) 3(-27.05,7.222) 4(-27.05,6.722) 5(-27.05,6.222) 6(-27.05,5.722) 7(-27.05,5.222) 8(-27.05,4.722) 9(-27.05,4.222) 10(-27.05,3.722) 11(-27.05,3.222) 12(-27.05,2.722) 13(-27.05,2.222) 14(-27.05,1.722) 15(-27.05,1.222) 16(-27.05,0.722) 17(-27.05,0.222) 18(-27.05,-0.278) 19(-27.05,-0.778) 20(-27.05,-1.278) 21(-27.05,-1.778) 22(-27.05,-2.278) 23(-27.05,-2.778) 24(-27.05,-3.278)
  rrect50% 0.8x0.4 smd: MP(-29.625,-4.278) MP(-29.625,9.222)
Top Overlay:
  region: -26.1,-3.278 -25.1,-2.778 -25.1,-3.778
  lines w0.2: -29.6,2.472 -28,2.472 ; -28.825,-4.728 -28.825,9.672 ; -2.5,0 2.5,0 ; 0,-2.5 0,2.5 ; -31.8,-14.8 -31.8,14.8 26,14.8 26,-14.8 -31.8,-14.8 ; -30.2,-4.728 -27.3,-4.728 -27.3,-4.278 -26.3,-4.278 -26.3,9.222 -27.2,9.222 -27.2,9.672 -30.2,9.672 -30.2,-4.728 ; -23.25,-12 23.25,-12 23.25,12 -23.25,12 -23.25,-12
  text "1" at -25.329,8.938 h1
  text "24" at -25.329,-4.807 h1
3D body "e2206ks0e1?_epaper.sldprt": height 3.85, standoff 3, extent -39.45,-14.748 26,14.752
3D body "FH34SRJ-24S-0.5SH.stp": height 1, standoff 0, extent -30.125,-4.528 -26.325,9.472

## ECX-12R [mm] "2.0 × 1.2 × 0.6 mm Crystal"
height 0.6
pads (2):
  rrect50% 0.8x1.3 smd paste-0.1: 1(-0.7,0) 2(0.7,0)
Top Overlay:
  lines w0.2: -1.25,-0.8 -1.25,0.8 1.25,0.8 1.25,-0.8 -1.25,-0.8
Mechanical 13:
  lines w0.1: -1.25,-0.8 1.25,-0.8 1.25,0.8 -1.25,0.8 -1.25,-0.8
Mechanical 15:
  lines w0.05: -1.25,-0.914 1.25,-0.914 1.25,0.924 -1.25,0.924 -1.25,-0.914
  lines w0.1: -0.5,0 0.5,0 ; 0,-0.5 0,0.5
3D body: height 0.6, standoff 0, extent -1,-0.6 1,0.6

## fiducial-0.5 [mm]
pads (1):
  round 0.5 smd paste-0.25 mask+0.5: F(0,0)

## HEADER_1X4P_2.54MM_TH [mm]
pads (4):
  rrect25% 1.6x1.6 hole 1: 1(0,3.81)
  round 1.6 hole 1: 2(0,1.27) 3(0,-1.27) 4(0,-3.81)
Top Overlay:
  lines w0.3: -1.905,3.81 -1.905,5.715 0,5.715 ; -1.27,-5.08 1.27,-5.08 1.27,5.08 -1.27,5.08 -1.27,-5.08